# Altium footprint library DrPCB.PcbLib: 910 footprints (part 49 of 57)
Each footprint in its own frame and in the unit in brackets; x right, y up, seen from the top. Pads: shape width x height; smd on the part's side, far side on the other; paste and mask are expansions set on the pad; w line width, h text height; cw(c..) or ccw(c..) is an arc to the next point about the centre after c.
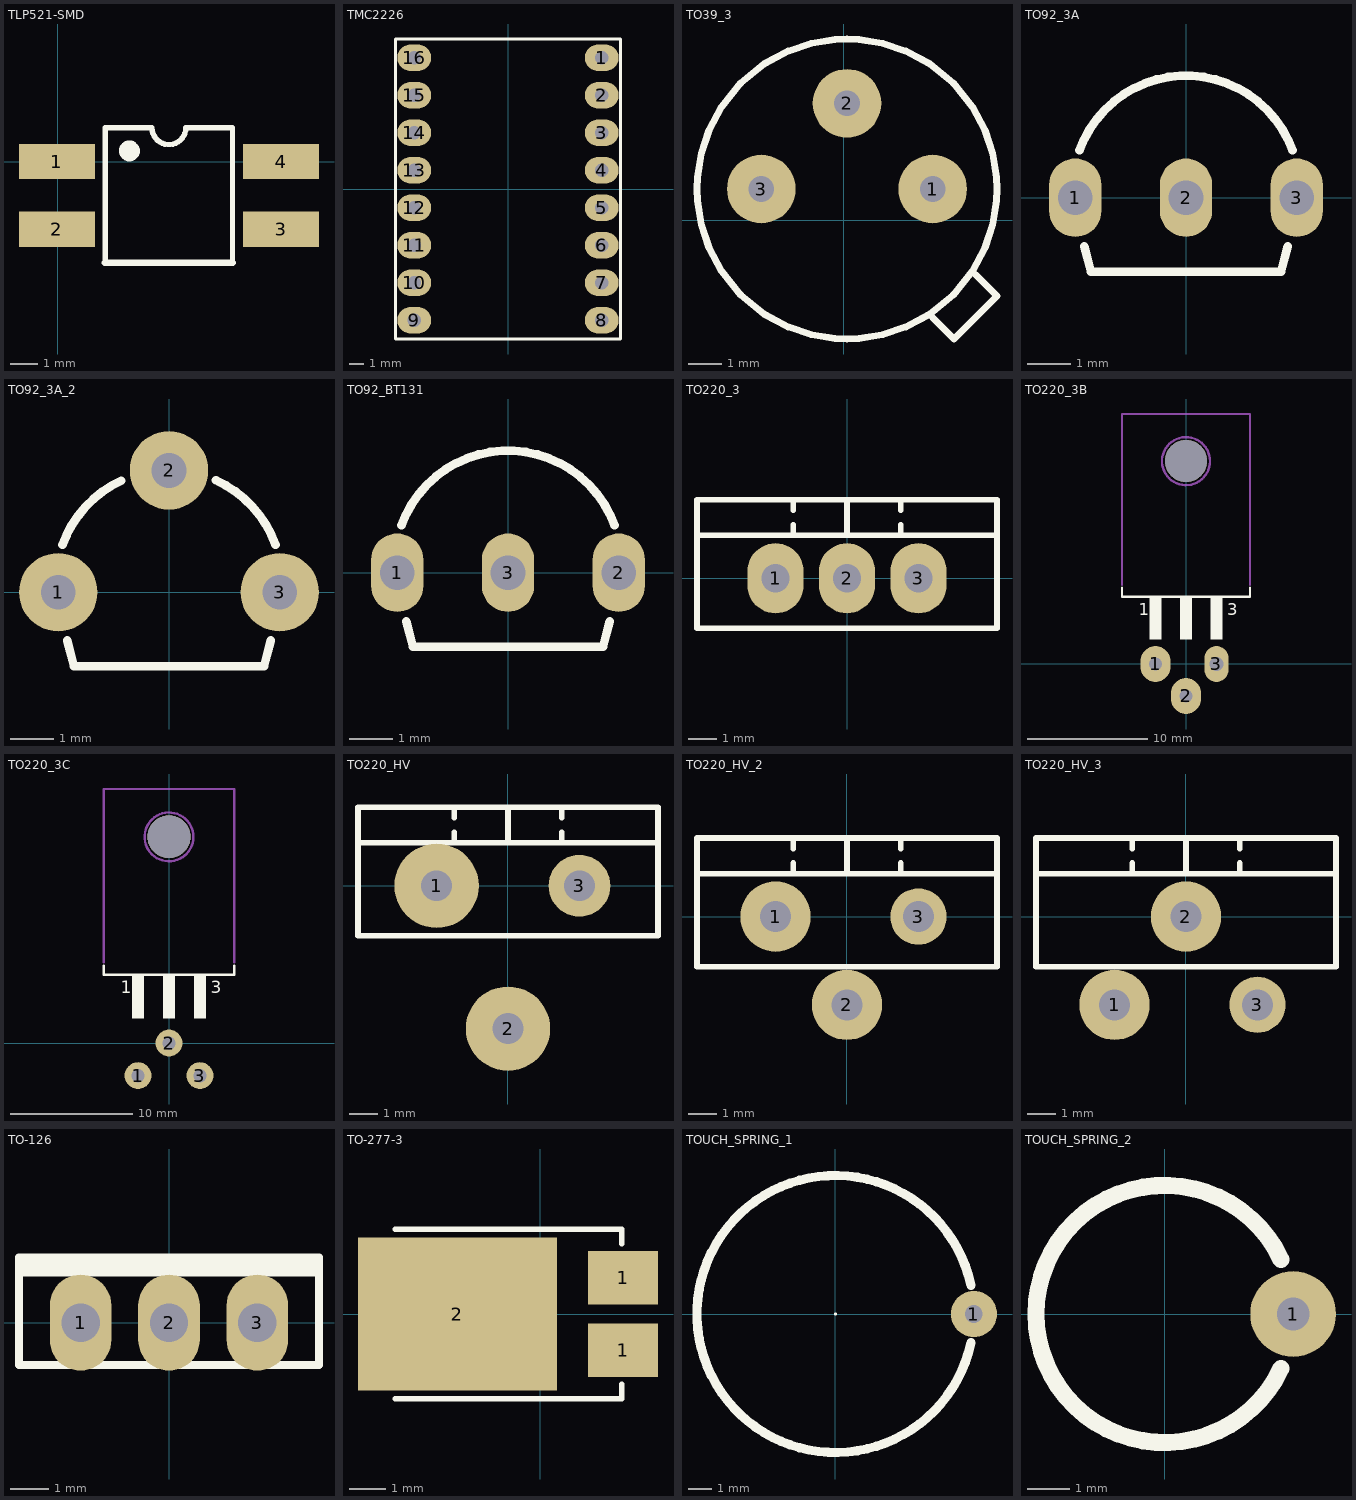
[diagram p48: the footprints below, top view; thin cyan lines are the x and y axes]

## TLP521-SMD [mm]
pads (4):
  rect 2.8x1.3 smd: 1(-0.038,0) 2(-0.038,-2.502) 3(8.23,-2.502) 4(8.23,0)
Top Overlay:
  circle w0.5: c2.634,0.394 r0.135
  lines w0.2: 1.74,-3.736 1.74,1.25 3.466,1.25 ccw(c4.091,1.25) 4.716,1.25 6.439,1.25 6.439,-3.736
  lines w0.254: 1.74,-3.736 6.439,-3.736

## TMC2226 [mm]
pads (16):
  oval 2.3x1.8 hole 0.9: 1(6.35,8.89) 2(6.35,6.35) 3(6.35,3.81) 4(6.35,1.27) 5(6.35,-1.27) 6(6.35,-3.81) 7(6.35,-6.35) 8(6.35,-8.89) 9(-6.35,-8.89) 10(-6.35,-6.35) 11(-6.35,-3.81) 12(-6.35,-1.27) 13(-6.35,1.27) 14(-6.35,3.81) 15(-6.35,6.35) 16(-6.35,8.89)
Top Overlay:
  lines w0.2: -7.62,-10.16 -7.62,10.16 7.62,10.16 7.62,-10.16 -7.62,-10.16
3D body "User Library-HeaderRangLuocDonThang2_54mm.step": height 8.5, standoff -3.2, extent 5.08,-10.16 7.62,10.16
3D body "User Library-HeaderRangLuocDonThang2_54mm.step": height 8.5, standoff -3.2, extent -7.62,-10.16 -5.08,10.16

## TO39_3 [mil]
pads (3):
  round 80 hole 30: 1(104.06,36.62) 2(4.06,136.62) 3(-95.94,36.62)
Top Overlay:
  lines w8: 104.06,-113.38 129.06,-138.38 179.06,-88.38 154.06,-63.38 ; -170.94,36.62 -170.44,22.92 -166.04,-4.58 -156.94,-32.08 -142.14,-59.58 -119.74,-87.08 -92.24,-109.48 -64.74,-124.28 -37.24,-133.48 -9.74,-137.88 4.06,-138.38 17.86,-137.88 45.36,-133.48 72.86,-124.28 100.36,-109.48 127.86,-87.08 150.26,-59.58 165.06,-32.08 174.16,-4.58 178.56,22.92 179.06,36.62 178.56,50.32 174.16,77.82 165.06,105.32 150.26,132.82 127.86,160.32 100.36,182.72 72.86,197.52 45.36,206.72 17.86,211.12 4.06,211.62 -9.74,211.12 -37.24,206.72 -64.74,197.52 -92.24,182.72 -119.74,160.32 -142.14,132.82 -156.94,105.32 -166.04,77.82 -170.44,50.32 -170.94,36.62
3D body "User Library-TO-39_TO-205AD.STEP": height 267.72, standoff -457.48, extent -180.4,-148.36 189.57,221.72

## TO92_3A [mm] "TO-92 BENDED TO-226, SOT54A"
pads (3):
  oval 1.2x1.8 hole 0.8: 1(-2.54,0) 2(0,0) 3(2.54,0)
Top Overlay:
  lines w0.2: -2.443,1.089 cw(c0,0.2) 2.443,1.089 ; -2.337,-1.11 -2.178,-1.7 2.178,-1.7 2.337,-1.11
3D body "User Library-TO-92_Bent.STEP": height 7.8, standoff -5.2, extent -2.79,-1.59 2.79,2.613

## TO92_3A_2 [mm] "TO-92 BENDED TO-226, SOT54A"
pads (3):
  round 1.8 hole 0.8: 1(-2.54,0) 2(0,2.794) 3(2.54,0)
Top Overlay:
  lines w0.2: -2.443,1.089 cw(c0,0.2) -1.095,2.558 ; -2.337,-1.11 -2.178,-1.7 2.178,-1.7 2.337,-1.11 ; 1.077,2.567 cw(c0,0.2) 2.443,1.089
3D body "User Library-TO-92_Bent.STEP": height 7.8, standoff -5.2, extent -2.79,-1.59 2.79,2.613

## TO92_BT131 [mm] "TO-92 BENDED TO-226, SOT54A"
pads (3):
  oval 1.2x1.8 hole 0.8: 1(-2.54,0) 2(2.54,0) 3(0,0)
Top Overlay:
  lines w0.2: -2.443,1.089 cw(c0,0.2) 2.443,1.089 ; -2.337,-1.11 -2.178,-1.7 2.178,-1.7 2.337,-1.11
3D body "User Library-TO-92_Bent.STEP": height 7.8, standoff -5.2, extent -2.79,-1.59 2.79,2.613

## TO220_3 [mm] "TO-220 3 LEAD, TO-262, pitch: 2.54mm  10x4.5mm"
pads (3):
  oval 2x2.5 hole 1: 1(-2.54,0) 2(0,0) 3(2.54,0)
Top Overlay:
  lines w0.2: -5.334,1.524 5.334,1.524 ; -1.905,1.524 -1.905,1.905 ; -1.905,2.413 -1.905,2.794 ; 0,1.524 0,2.794 ; 1.905,1.524 1.905,1.905 ; 1.905,2.413 1.905,2.794 ; -5.334,-1.778 -5.334,2.794 5.334,2.794 5.334,-1.778 -5.334,-1.778
3D body "User Library-TO3B_(TO220)_1.step": height 19, standoff -9.4, extent -5.2,-1.85 5.2,2.65

## TO220_3B [mm] "TO-220 3LEAD, pitch: 2.54mm  10x15mm"
pads (3):
  oval 2.5x3 hole 1.1: 1(-2.54,0) 2(0,-2.667)
  oval 2x3 hole 1.2: 3(2.54,0)
via 0,16.912 diameter 3.5 hole 3.5
Top Overlay:
  rectangle: -0.508,2.032 0.508,5.588
  rectangle: 2.032,2.032 3.048,5.588
  rectangle: -3.048,2.032 -2.032,5.588
  lines w0.2: -5.334,6.35 -5.334,5.588 5.334,5.588 5.334,6.35
  text "3" at 3.429,4.064 h1.02
  text "1" at -3.937,4.064 h1.02
Mechanical 1:
  circle w0.2: c0,16.9 r2
  lines w0.2: -5.334,6.604 -5.334,20.828 5.334,20.828 5.334,6.604
3D body "User Library-TO220 L.step": height 4.5, standoff -3, extent -5,0 5,19.704

## TO220_3C [mm] "TO-220 3LEAD, pitch: 2.54mm  10x15mm"
pads (3):
  round 2.2 hole 1.1: 1(-2.54,-2.667) 2(0,0) 3(2.54,-2.667)
via 0,16.912 diameter 3.5 hole 3.5
Top Overlay:
  rectangle: -0.508,2.032 0.508,5.588
  rectangle: 2.032,2.032 3.048,5.588
  rectangle: -3.048,2.032 -2.032,5.588
  lines w0.2: -5.334,6.35 -5.334,5.588 5.334,5.588 5.334,6.35
  text "3" at 3.429,4.064 h1.02
  text "1" at -3.937,4.064 h1.02
Mechanical 1:
  circle w0.2: c0,16.9 r2
  lines w0.2: -5.334,6.604 -5.334,20.828 5.334,20.828 5.334,6.604
3D body "User Library-TO220 L.step": height 4.5, standoff -3, extent -5,0 5,19.704

## TO220_HV [mm]
pads (3):
  round 3 hole 1.1: 1(-2.54,0) 2(0,-5.08)
  round 2.2 hole 1.1: 3(2.54,0)
Top Overlay:
  lines w0.2: -5.334,1.524 5.334,1.524 ; -1.905,1.524 -1.905,1.905 ; -1.905,2.413 -1.905,2.794 ; 0,1.524 0,2.794 ; 1.905,1.524 1.905,1.905 ; 1.905,2.413 1.905,2.794 ; -5.334,-1.778 5.334,-1.778 5.334,2.794 -5.334,2.794 -5.334,-1.778
3D body "User Library-TO220-2_V-S.STEP": height 19.3, standoff -2.9, extent -5.03,-1.706 4.97,2.794

## TO220_HV_2 [mm]
pads (3):
  round 2.5 hole 1.1: 1(-2.54,0) 2(0,-3.137)
  round 2 hole 1.1: 3(2.54,0)
Top Overlay:
  lines w0.2: -5.334,1.524 5.334,1.524 ; -1.905,1.524 -1.905,1.905 ; -1.905,2.413 -1.905,2.794 ; 0,1.524 0,2.794 ; 1.905,1.524 1.905,1.905 ; 1.905,2.413 1.905,2.794 ; -5.334,-1.778 -5.334,2.794 5.334,2.794 5.334,-1.778 -5.334,-1.778
3D body "User Library-TO220-2_V-S.STEP": height 19.3, standoff -2.9, extent -5.03,-1.706 4.97,2.794

## TO220_HV_3 [mm]
pads (3):
  round 2.5 hole 1.1: 1(-2.54,-3.137) 2(0,0)
  round 2 hole 1.1: 3(2.54,-3.137)
Top Overlay:
  lines w0.2: -5.334,1.524 5.334,1.524 ; -1.905,1.524 -1.905,1.905 ; -1.905,2.413 -1.905,2.794 ; 0,1.524 0,2.794 ; 1.905,1.524 1.905,1.905 ; 1.905,2.413 1.905,2.794 ; -5.334,-1.778 -5.334,2.794 5.334,2.794 5.334,-1.778 -5.334,-1.778
3D body "User Library-TO220-2_V-S.STEP": height 19.3, standoff -2.9, extent -5.03,-1.706 4.97,2.794

## TO-126 [mm] "TO126, TO-126, SOT32 (PHIPLIPS), pitch: 2.3mm, 8X3mm"
pads (3):
  oval 1.6x2.5 hole 1: 1(-2.3,0) 2(0,0) 3(2.3,0)
Top Overlay:
  rectangle: -3.9,1.2 3.9,1.7
  lines w0.2: -3.9,-1.1 3.9,-1.1 3.9,1.7 -3.9,1.7 -3.9,-1.1
3D body "User Library-TO-126 (SOT32) Gold PCB.STEP": height 13.19, standoff -3.54, extent -3.8,-1 3.8,1.55

## TO-277-3 [mm]
pads (3):
  rect 1.9x1.45 smd: 1(2.25,-0.985) 1(2.25,0.985)
  rect 5.4x4.15 smd: 2(-2.25,0)
Top Overlay:
  lines w0.15: -3.932,-2.3 2.218,-2.3 2.218,-1.905 ; -3.932,2.3 2.218,2.3 2.218,1.905
3D body "FSV12100V.STEP": height 1.19, standoff -0.01, extent -4.1,-2.22 2.4,2.22

## TOUCH_SPRING_1 [mm]
pads (1):
  round 2 hole 0.762: 1(6,0)
Top Overlay:
  circle w0.1: c0,0 r0.018
  lines w0.4: 5.869,-1.247 cw(c0,0) 5.869,1.247
3D body "User Library-spring-7.step": height 12.6, standoff 0.1, extent -6.1,-6.1 6.1,6.1

## TOUCH_SPRING_2 [mm]
pads (1):
  round 2 hole 0.762: 1(3,0)
Top Overlay:
  lines w0.4: 2.719,-1.268 cw(c0,0) 2.719,1.268